# Altium schematic symbol library AliPadash.SchLib: 1186 symbols (part 1 of 6) (continued)
## 1488
designator U?
footprint DIP14
part A pins: 1 V- (power) hidden to V-, 2 (in), 3 (oc), 7 GND (power) hidden to GND, 14 V+ (power) hidden to V+
part B pins: 1 V- (power) hidden to V-, 4 (in), 5 (in), 6 (oc), 7 GND (power) hidden to GND, 14 V+ (power) hidden to V+
part C pins: 1 V- (power) hidden to V-, 7 GND (power) hidden to GND, 8 (oc), 9 (in), 10 (in), 14 V+ (power) hidden to V+
part D pins: 1 V- (power) hidden to V-, 7 GND (power) hidden to GND, 11 (oc), 12 (in), 13 (in), 14 V+ (power) hidden to V+

## 1489
designator U?
footprint DIP14
part A pins: 1 I (in), 2 RC (in), 3 O (out), 7 GND (power) hidden to GND, 14 VCC (power) hidden to VCC
part B pins: 4 I (in), 5 RC (in), 6 O (out), 7 GND (power) hidden to GND, 14 VCC (power) hidden to VCC
part C pins: 7 GND (power) hidden to GND, 8 O (out), 9 RC (in), 10 I (in), 14 VCC (power) hidden to VCC
part D pins: 7 GND (power) hidden to GND, 11 O (out), 12 RC (in), 13 I (in), 14 VCC (power) hidden to VCC

## 2681-40PIN
designator U?
footprint DIP40
pins: 1 A0 (in), 2 IP3 (in), 3 A1 (in), 4 IP1 (in), 5 A2 (in), 6 A3 (in), 7 IP0 (in), 8 WRN (in), 9 RDN (in), 10 RXDB (in), 11 TXDB (out), 12 OP1 (out), 13 OP3 (out), 14 OP5 (out), 15 OP7 (out), 16 D1 (io), 17 D3 (io), 18 D5 (io), 19 D7 (io), 20 GND (power), 21 INTRN (out), 22 D6 (io), 23 D4 (io), 24 D2 (io), 25 D0 (io), 26 OP6 (out), 27 OP4 (out), 28 OP2 (out), 29 OP0 (out), 30 TXDA (out), 31 RXDA (in), 32 X1/CLK (in), 33 X2 (in), 34 RESET (in), 35 CEN (in), 36 IP2 (in), 37 IP6 (in), 38 IP5 (in), 39 IP4 (in), 40 VCC (power)

## 4052
designator ?
pins: 1 Y0, 2 Y2, 3 Y, 4 Y3, 5 Y1, 6 INH (in), 7 VEE, 8 GND (power), 9 B (in), 10 A (in), 11 X3, 12 X0, 13 X, 14 X1, 15 X2, 16 VCC (power)

## 4098
designator ?
part A pins: 1 1Cext, 2 1RCext, 3 ~{1R}, 4 1TR+, 5 ~{1TR-}, 6 1Q, 7 ~{1Q}, 8 GND, 16 VDD
part B pins: 8 GND, 9 ~{2Q}, 10 2Q, 11 ~{2TR-}, 12 2TR+, 13 ~{2R}, 14 2RCext, 15 2Cext, 16 VDD

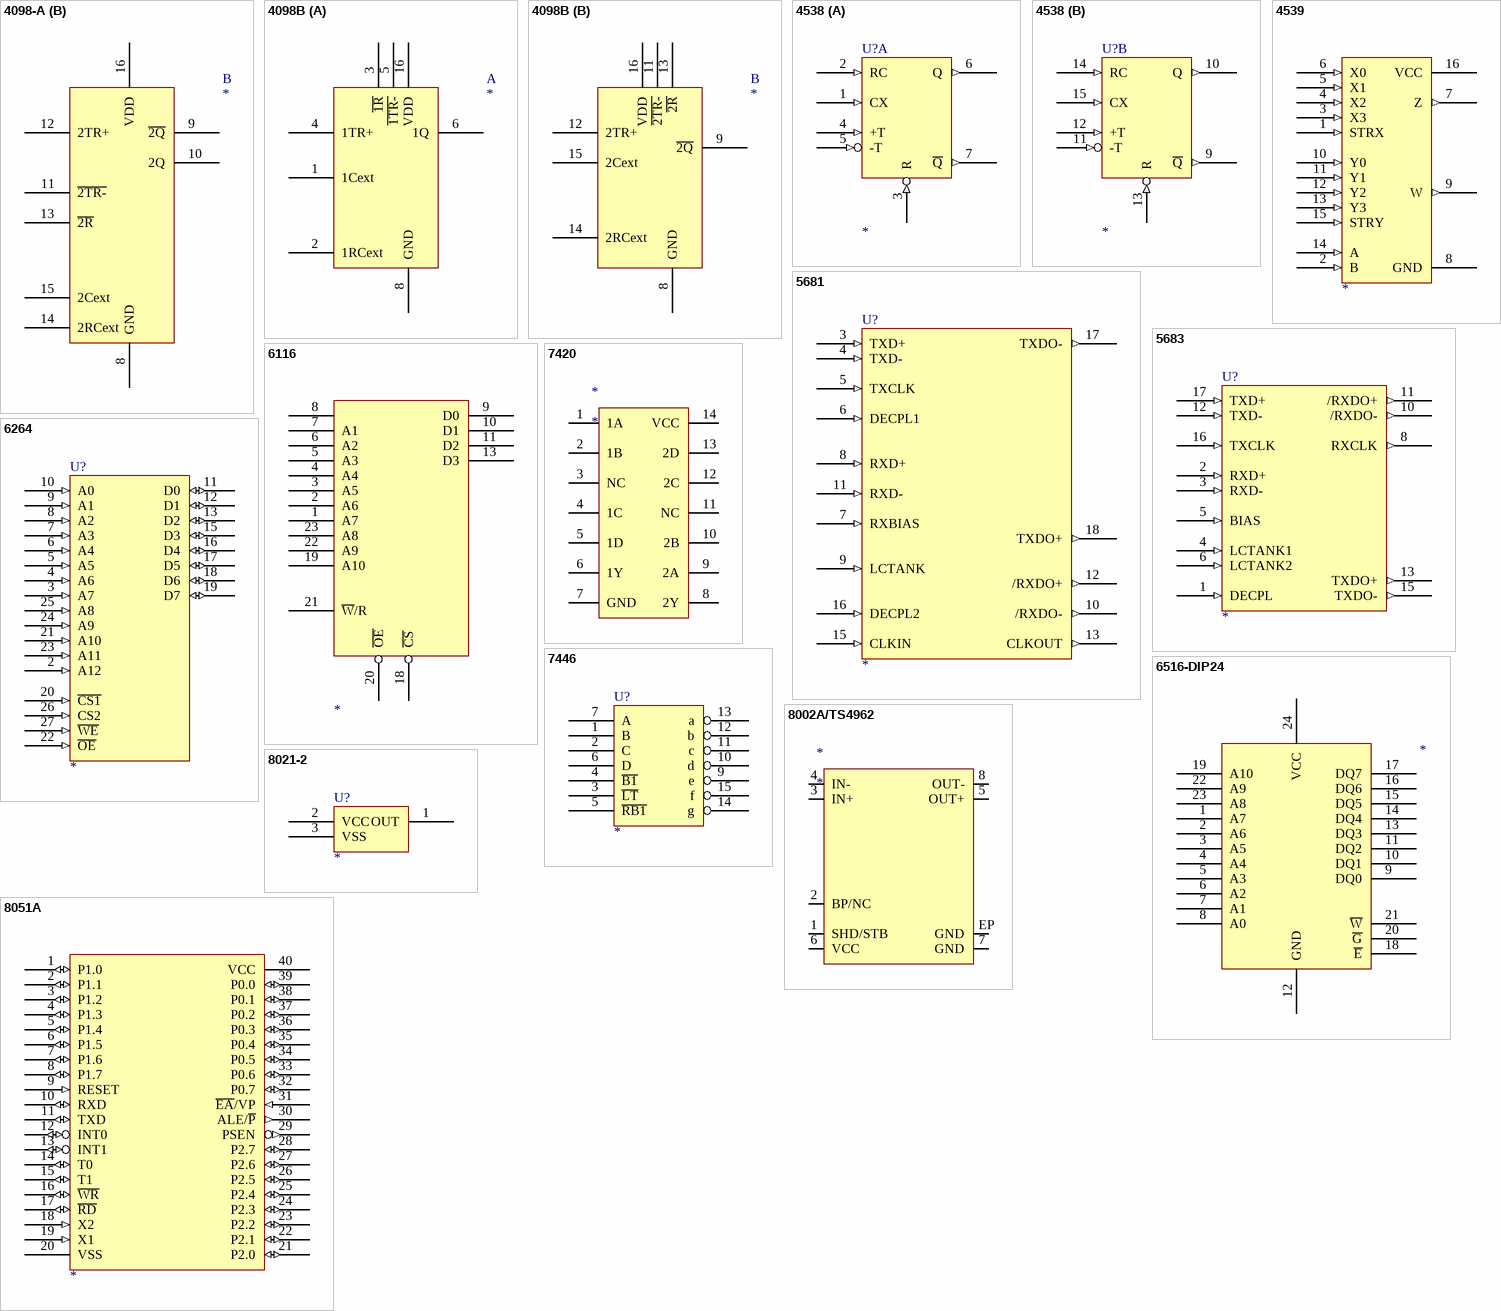
[diagram p4: symbols 4098-A to 8051A]

## 4098-A
designator ?
part A pins: 1 1Cext, 2 1RCext, 3 ~{1R}, 4 1TR+, 5 ~{1TR-}, 6 1Q, 7 ~{1Q}, 8 GND, 16 VDD
part B pins: 8 GND, 9 ~{2Q}, 10 2Q, 11 ~{2TR-}, 12 2TR+, 13 ~{2R}, 14 2RCext, 15 2Cext, 16 VDD

## 4098B
designator ?
part A pins: 1 1Cext, 2 1RCext, 3 ~{1R}, 4 1TR+, 5 ~{1TR-}, 6 1Q, 8 GND, 16 VDD
part B pins: 8 GND, 9 ~{2Q}, 11 ~{2TR-}, 12 2TR+, 13 ~{2R}, 14 2RCext, 15 2Cext, 16 VDD

## 4538
designator U?
part A pins: 1 CX (in), 2 RC (in), 3 R (in), 4 +T (in), 5 -T (in), 6 Q (out), 7 ~{Q} (out), 8 VSS (power) hidden to VSS, 16 VDD (power) hidden to VDD
part B pins: 8 VSS (power) hidden to VSS, 9 ~{Q} (out), 10 Q (out), 11 -T (in), 12 +T (in), 13 R (in), 14 RC (in), 15 CX (in), 16 VDD (power) hidden to VDD

## 4539
designator ?
pins: 1 STRX (in), 2 B (in), 3 X3 (in), 4 X2 (in), 5 X1 (in), 6 X0 (in), 7 Z (out), 8 GND (power), 9 W (out), 10 Y0 (in), 11 Y1 (in), 12 Y2 (in), 13 Y3 (in), 14 A (in), 15 STRY (in), 16 VCC (power)

## 5681
designator U?
pins: 1 GND (power) hidden to GND, 2 GND (power) hidden to GND, 3 TXD+ (in), 4 TXD- (in), 5 TXCLK (in), 6 DECPL1 (in), 7 RXBIAS (in), 8 RXD+ (in), 9 LCTANK (in), 10 /RXDO- (out), 11 RXD- (in), 12 /RXDO+ (out), 13 CLKOUT (out), 14 VEE (power) hidden to VEE, 15 CLKIN (in), 16 DECPL2 (in), 17 TXDO- (out), 18 TXDO+ (out)

## 5683
designator U?
pins: 1 DECPL (in), 2 RXD+ (in), 3 RXD- (in), 4 LCTANK1 (in), 5 BIAS (in), 6 LCTANK2 (in), 7 GND (power) hidden to GND, 8 RXCLK (out), 9 VCC (power) hidden to VCC, 10 /RXDO- (out), 11 /RXDO+ (out), 12 TXD- (in), 13 TXDO+ (out), 14 GND (power) hidden to GND, 15 TXDO- (out), 16 TXCLK (in), 17 TXD+ (in), 18 VCC (power) hidden to VCC

## 6116
designator ?
pins: 1 A7, 2 A6, 3 A5, 4 A4, 5 A3, 6 A2, 7 A1, 8 A0, 9 D0, 10 D1, 11 D2, 13 D3, 18 ~{CS}, 19 A10, 20 ~{OE}, 21 ~{W}/R, 22 A9, 23 A8

## 6264
designator U?
pins: 2 A12 (in), 3 A7 (in), 4 A6 (in), 5 A5 (in), 6 A4 (in), 7 A3 (in), 8 A2 (in), 9 A1 (in), 10 A0 (in), 11 D0 (io), 12 D1 (io), 13 D2 (io), 14 GND (power) hidden to GND, 15 D3 (io), 16 D4 (io), 17 D5 (io), 18 D6 (io), 19 D7 (io), 20 ~{CS1} (in), 21 A10 (in), 22 ~{OE} (in), 23 A11 (in), 24 A9 (in), 25 A8 (in), 26 CS2 (in), 27 ~{WE} (in), 28 VCC (power) hidden to VCC

## 6516-DIP24
designator ?
U?
footprint DIP24
pins: 1 A7, 2 A6, 3 A5, 4 A4, 5 A3, 6 A2, 7 A1, 8 A0, 9 DQ0, 10 DQ1, 11 DQ2, 12 GND (power), 13 DQ3, 14 DQ4, 15 DQ5, 16 DQ6, 17 DQ7, 18 ~{E}, 19 A10, 20 ~{G}, 21 ~{W}, 22 A9, 23 A8, 24 VCC (power)

## 7420
designator *
pins: 1 1A, 2 1B, 3 NC, 4 1C, 5 1D, 6 1Y, 7 GND, 8 2Y, 9 2A, 10 2B, 11 NC, 12 2C, 13 2D, 14 VCC

## 7446
designator U?
footprint DIP16
pins: 1 B, 2 C, 3 ~{LT}, 4 ~{B1}, 5 ~{RB1}, 6 D, 7 A, 8 GND (power) hidden to GND, 9 e (oc), 10 d (oc), 11 c (oc), 12 b (oc), 13 a (oc), 14 g (oc), 15 f (oc), 16 VCC (power) hidden to VCC

## 8002A/TS4962
designator *
footprint SO-8/DFN8 (Footprint not found)
pins: 1 SHD/STB, 2 BP/NC, 3 IN+, 4 IN-, 5 OUT+, 6 VCC, 7 GND, 8 OUT-, EP GND

## 8021-2
designator U?
footprint TO-92
pins: 1 OUT, 2 VCC, 3 VSS

## 8051A
designator ?
pins: 1 P1.0 (io), 2 P1.1 (io), 3 P1.2 (io), 4 P1.3 (io), 5 P1.4 (io), 6 P1.5 (io), 7 P1.6 (io), 8 P1.7 (io), 9 RESET (in), 10 RXD (io), 11 TXD (io), 12 INT0 (io), 13 INT1 (io), 14 T0 (io), 15 T1 (io), 16 ~{WR} (io), 17 ~{RD} (io), 18 X2 (in), 19 X1 (in), 20 VSS (power), 21 P2.0 (io), 22 P2.1 (io), 23 P2.2 (io), 24 P2.3 (io), 25 P2.4 (io), 26 P2.5 (io), 27 P2.6 (io), 28 P2.7 (io), 29 PSEN (out), 30 ALE/~{P} (out), 31 ~{EA}/VP (in), 32 P0.7 (io), 33 P0.6 (io), 34 P0.5 (io), 35 P0.4 (io), 36 P0.3 (io), 37 P0.2 (io), 38 P0.1 (io), 39 P0.0 (io), 40 VCC (power)

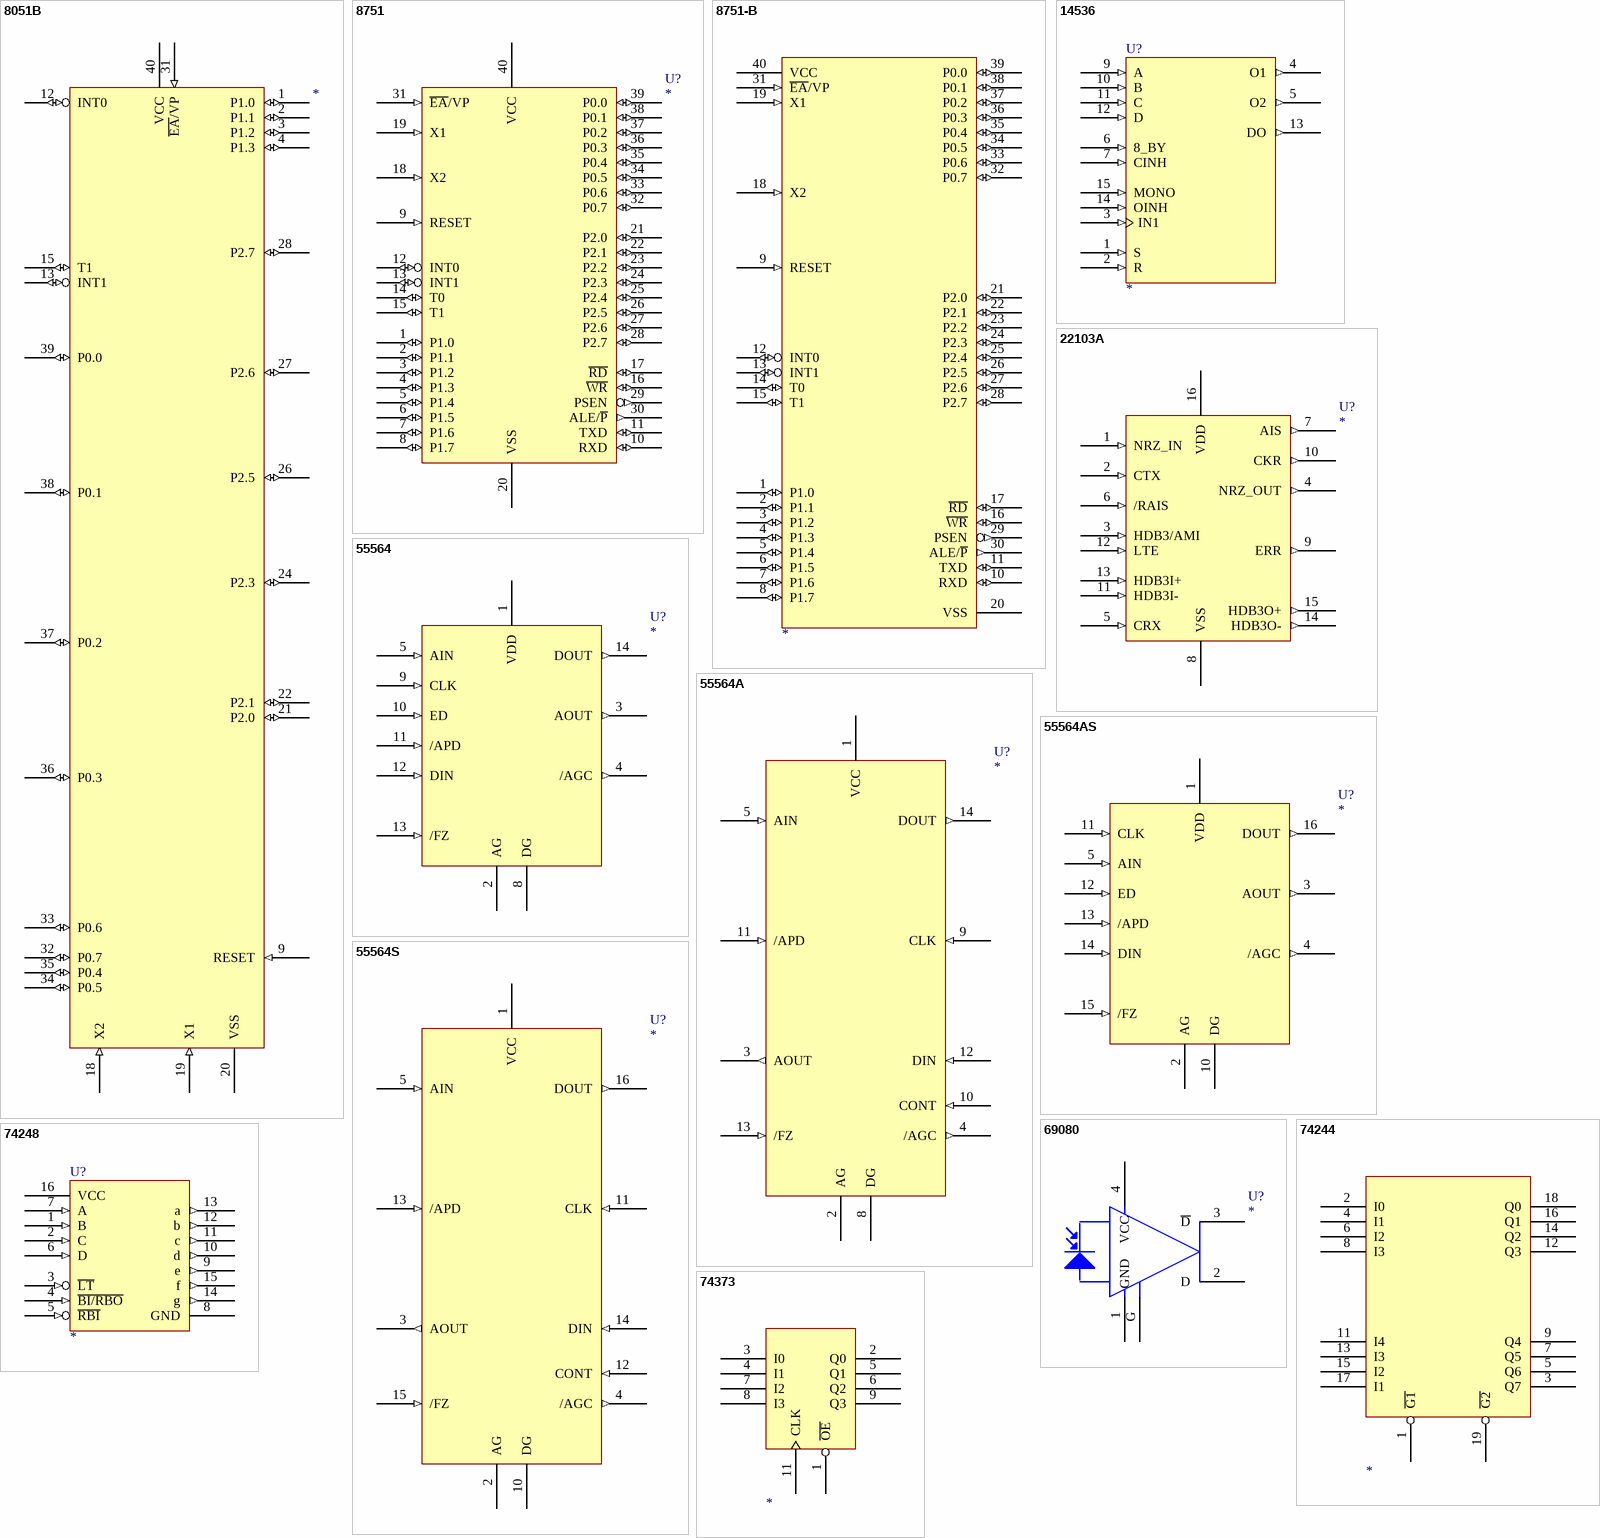
[diagram p5: symbols 8051B to 74373]

## 8051B
designator ?
pins: 1 P1.0 (io), 2 P1.1 (io), 3 P1.2 (io), 4 P1.3 (io), 9 RESET (in), 12 INT0 (io), 13 INT1 (io), 15 T1 (io), 18 X2 (in), 19 X1 (in), 20 VSS (power), 21 P2.0 (io), 22 P2.1 (io), 24 P2.3 (io), 26 P2.5 (io), 27 P2.6 (io), 28 P2.7 (io), 31 ~{EA}/VP (in), 32 P0.7 (io), 33 P0.6 (io), 34 P0.5 (io), 35 P0.4 (io), 36 P0.3 (io), 37 P0.2 (io), 38 P0.1 (io), 39 P0.0 (io), 40 VCC (power)

## 8751
designator U?
pins: 1 P1.0 (io), 2 P1.1 (io), 3 P1.2 (io), 4 P1.3 (io), 5 P1.4 (io), 6 P1.5 (io), 7 P1.6 (io), 8 P1.7 (io), 9 RESET (in), 10 RXD (io), 11 TXD (io), 12 INT0 (io), 13 INT1 (io), 14 T0 (io), 15 T1 (io), 16 ~{WR} (io), 17 ~{RD} (io), 18 X2 (in), 19 X1 (in), 20 VSS (power), 21 P2.0 (io), 22 P2.1 (io), 23 P2.2 (io), 24 P2.3 (io), 25 P2.4 (io), 26 P2.5 (io), 27 P2.6 (io), 28 P2.7 (io), 29 PSEN (out), 30 ALE/~{P} (out), 31 ~{EA}/VP (in), 32 P0.7 (io), 33 P0.6 (io), 34 P0.5 (io), 35 P0.4 (io), 36 P0.3 (io), 37 P0.2 (io), 38 P0.1 (io), 39 P0.0 (io), 40 VCC (power)

## 8751-B
designator ?
pins: 1 P1.0 (io), 2 P1.1 (io), 3 P1.2 (io), 4 P1.3 (io), 5 P1.4 (io), 6 P1.5 (io), 7 P1.6 (io), 8 P1.7 (io), 9 RESET (in), 10 RXD (io), 11 TXD (io), 12 INT0 (io), 13 INT1 (io), 14 T0 (io), 15 T1 (io), 16 ~{WR} (io), 17 ~{RD} (io), 18 X2 (in), 19 X1 (in), 20 VSS (power), 21 P2.0 (io), 22 P2.1 (io), 23 P2.2 (io), 24 P2.3 (io), 25 P2.4 (io), 26 P2.5 (io), 27 P2.6 (io), 28 P2.7 (io), 29 PSEN (out), 30 ALE/~{P} (out), 31 ~{EA}/VP (in), 32 P0.7 (io), 33 P0.6 (io), 34 P0.5 (io), 35 P0.4 (io), 36 P0.3 (io), 37 P0.2 (io), 38 P0.1 (io), 39 P0.0 (io), 40 VCC (power)

## 14536
designator U?
footprint DIP16
pins: 1 S (in), 2 R (in), 3 IN1 (in), 4 O1 (out), 5 O2 (out), 6 8_BY (in), 7 CINH (in), 8 GND (power) hidden to GND, 9 A (in), 10 B (in), 11 C (in), 12 D (in), 13 DO (out), 14 OINH (in), 15 MONO (in), 16 VCC (power) hidden to VCC

## 22103A
designator U?
footprint DIP16
pins: 1 NRZ_IN (in), 2 CTX (in), 3 HDB3/AMI (in), 4 NRZ_OUT (out), 5 CRX (in), 6 /RAIS (in), 7 AIS (out), 8 VSS (power), 9 ERR (out), 10 CKR (out), 11 HDB3I- (in), 12 LTE (in), 13 HDB3I+ (in), 14 HDB3O- (out), 15 HDB3O+ (out), 16 VDD (power)

## 55564
designator U?
pins: 1 VDD, 2 AG, 3 AOUT (out), 4 /AGC (out), 5 AIN (in), 8 DG, 9 CLK (in), 10 ED (in), 11 /APD (in), 12 DIN (in), 13 /FZ (in), 14 DOUT (out)

## 55564A
designator U?
pins: 1 VCC, 2 AG, 3 AOUT (out), 4 /AGC (out), 5 AIN (in), 8 DG, 9 CLK (in), 10 CONT (in), 11 /APD (in), 12 DIN (in), 13 /FZ (in), 14 DOUT (out)

## 55564AS
designator U?
pins: 1 VDD, 2 AG, 3 AOUT (out), 4 /AGC (out), 5 AIN (in), 10 DG, 11 CLK (in), 12 ED (in), 13 /APD (in), 14 DIN (in), 15 /FZ (in), 16 DOUT (out)

## 55564S
designator U?
pins: 1 VCC, 2 AG, 3 AOUT (out), 4 /AGC (out), 5 AIN (in), 10 DG, 11 CLK (in), 12 CONT (in), 13 /APD (in), 14 DIN (in), 15 /FZ (in), 16 DOUT (out)

## 69080
designator U?
footprint LDHP3
pins: 1 GND, 2 D, 3 ~{D}, 4 VCC, G

## 74244
designator ?
pins: 1 ~{G1}, 2 I0, 3 Q7, 4 I1, 5 Q6, 6 I2, 7 Q5, 8 I3, 9 Q4, 11 I4, 12 Q3, 13 I3, 14 Q2, 15 I2, 16 Q1, 17 I1, 18 Q0, 19 ~{G2}

## 74248
designator U?
footprint DIP16
pins: 1 B (in), 2 C (in), 3 ~{LT} (in), 4 ~{BI/RBO} (in), 5 ~{RBI} (in), 6 D (in), 7 A (in), 8 GND (power), 9 e (out), 10 d (out), 11 c (out), 12 b (out), 13 a (out), 14 g (out), 15 f (out), 16 VCC (power)

## 74373
designator ?
pins: 1 ~{OE}, 2 Q0, 3 I0, 4 I1, 5 Q1, 6 Q2, 7 I2, 8 I3, 9 Q3, 11 CLK

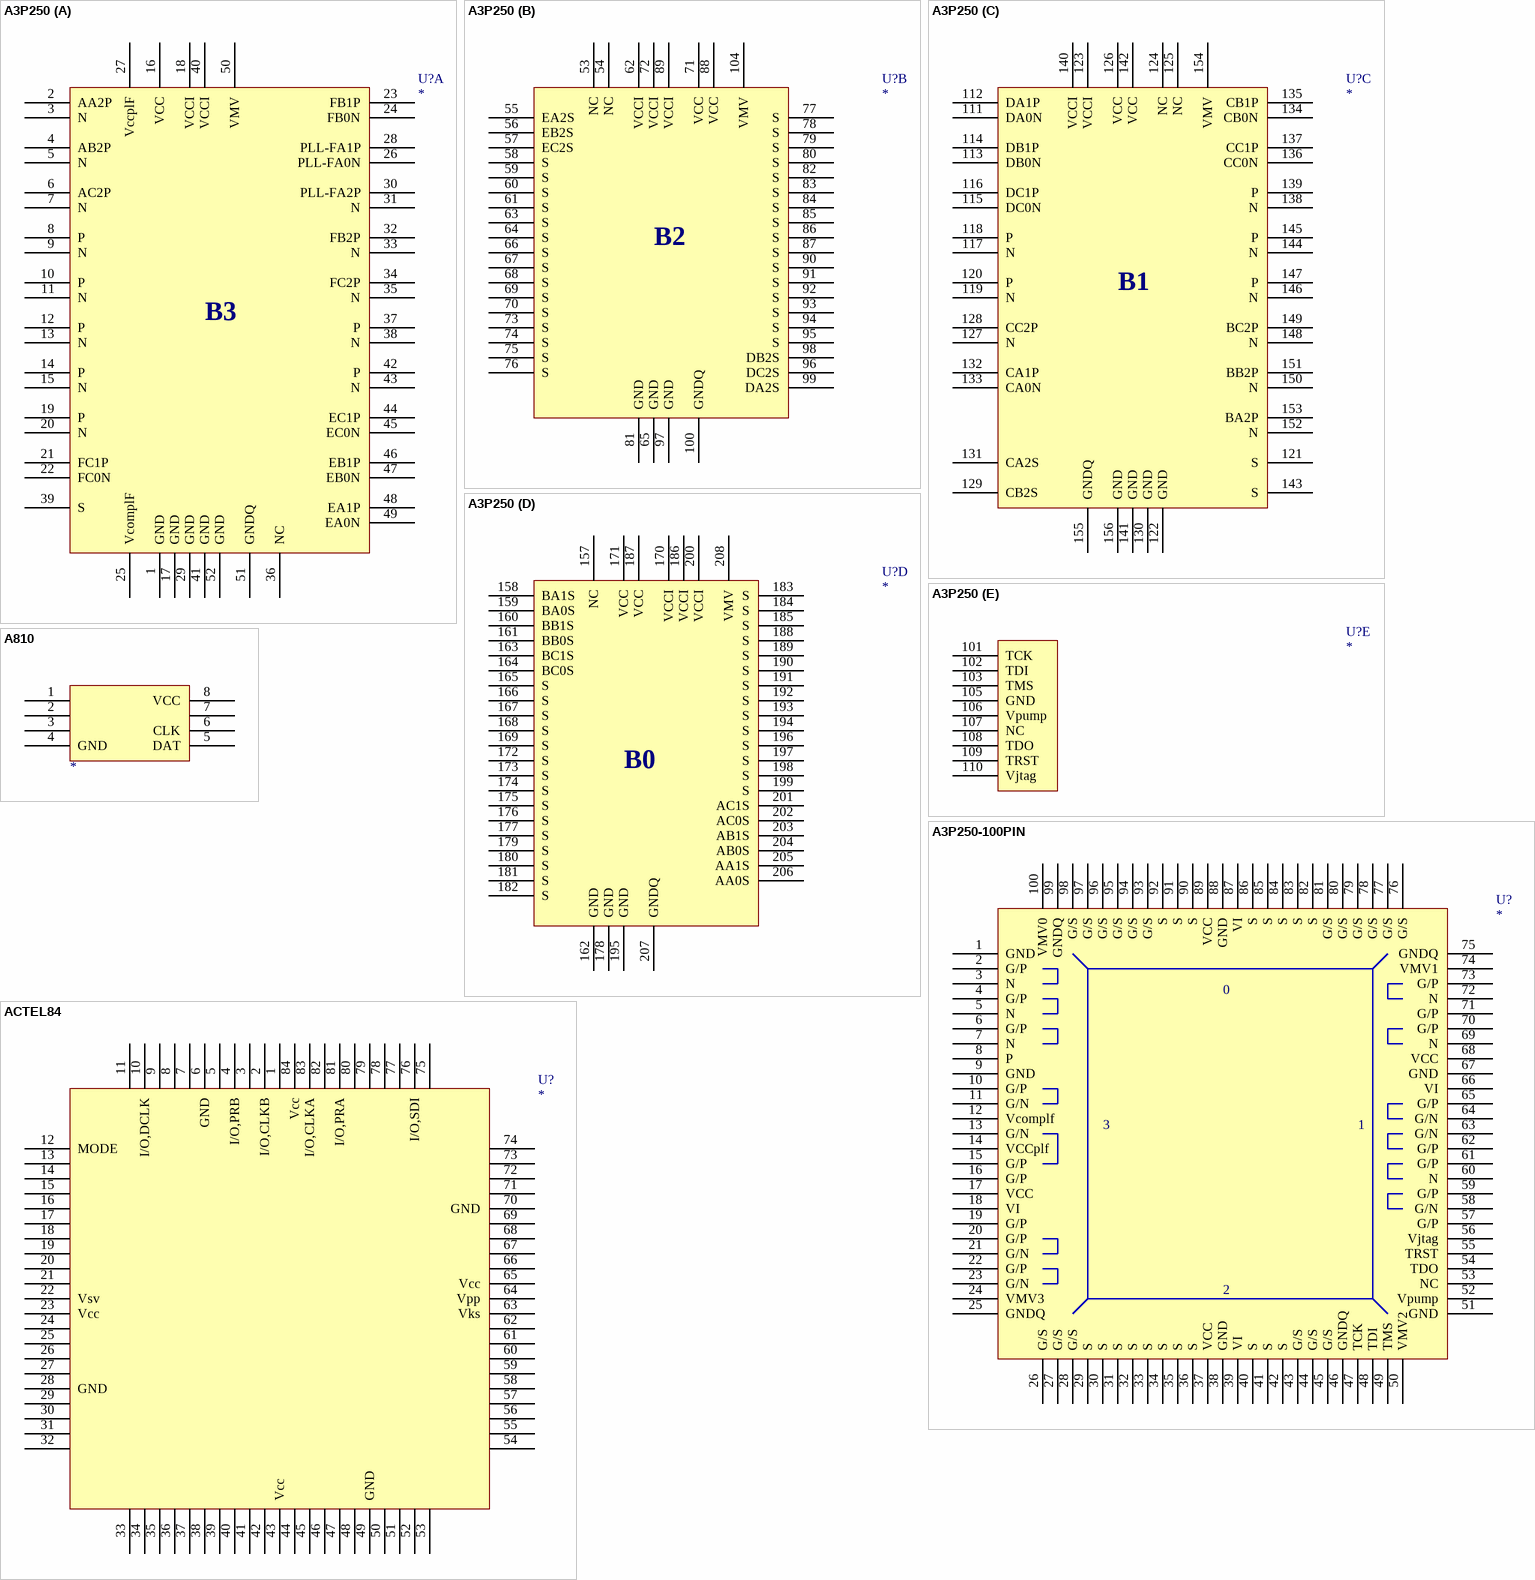
[diagram p6: symbols A3P250 to ACTEL84]

## A3P250
designator U?
footprint PQFP208
part A pins: 1 GND, 2 AA2P, 3 N, 4 AB2P, 5 N, 6 AC2P, 7 N, 8 P, 9 N, 10 P, 11 N, 12 P, 13 N, 14 P, 15 N, 16 VCC, 17 GND, 18 VCCI, 19 P, 20 N, 21 FC1P, 22 FC0N, 23 FB1P, 24 FB0N, 25 VcomplF, 26 PLL-FA0N, 27 VccplF, 28 PLL-FA1P, 29 GND, 30 PLL-FA2P, 31 N, 32 FB2P, 33 N, 34 FC2P, 35 N, 36 NC, 37 P, 38 N, 39 S, 40 VCCI, 41 GND, 42 P, 43 N, 44 EC1P, 45 EC0N, 46 EB1P, 47 EB0N, 48 EA1P, 49 EA0N, 50 VMV, 51 GNDQ, 52 GND
part B pins: 53 NC, 54 NC, 55 EA2S, 56 EB2S, 57 EC2S, 58 S, 59 S, 60 S, 61 S, 62 VCCI, 63 S, 64 S, 65 GND, 66 S, 67 S, 68 S, 69 S, 70 S, 71 VCC, 72 VCCI, 73 S, 74 S, 75 S, 76 S, 77 S, 78 S, 79 S, 80 S, 81 GND, 82 S, 83 S, 84 S, 85 S, 86 S, 87 S, 88 VCC, 89 VCCI, 90 S, 91 S, 92 S, 93 S, 94 S, 95 S, 96 DC2S, 97 GND, 98 DB2S, 99 DA2S, 100 GNDQ, 104 VMV
part C pins: 111 DA0N, 112 DA1P, 113 DB0N, 114 DB1P, 115 DC0N, 116 DC1P, 117 N, 118 P, 119 N, 120 P, 121 S, 122 GND, 123 VCCI, 124 NC, 125 NC, 126 VCC, 127 N, 128 CC2P, 129 CB2S, 130 GND, 131 CA2S, 132 CA1P, 133 CA0N, 134 CB0N, 135 CB1P, 136 CC0N, 137 CC1P, 138 N, 139 P, 140 VCCI, 141 GND, 142 VCC, 143 S, 144 N, 145 P, 146 N, 147 P, 148 N, 149 BC2P, 150 N, 151 BB2P, 152 N, 153 BA2P, 154 VMV, 155 GNDQ, 156 GND
part D pins: 157 NC, 158 BA1S, 159 BA0S, 160 BB1S, 161 BB0S, 162 GND, 163 BC1S, 164 BC0S, 165 S, 166 S, 167 S, 168 S, 169 S, 170 VCCI, 171 VCC, 172 S, 173 S, 174 S, 175 S, 176 S, 177 S, 178 GND, 179 S, 180 S, 181 S, 182 S, 183 S, 184 S, 185 S, 186 VCCI, 187 VCC, 188 S, 189 S, 190 S, 191 S, 192 S, 193 S, 194 S, 195 GND, 196 S, 197 S, 198 S, 199 S, 200 VCCI, 201 AC1S, 202 AC0S, 203 AB1S, 204 AB0S, 205 AA1S, 206 AA0S, 207 GNDQ, 208 VMV
part E pins: 101 TCK, 102 TDI, 103 TMS, 105 GND, 106 Vpump, 107 NC, 108 TDO, 109 TRST, 110 Vjtag
part A text: B3
part B text: B2
part C text: B1
part D text: B0

## A3P250-100PIN
designator U?
footprint PQFP100
pins: 1 GND, 2 G/P, 3 N, 4 G/P, 5 N, 6 G/P, 7 N, 8 P, 9 GND, 10 G/P, 11 G/N, 12 Vcomplf, 13 G/N, 14 VCCplf, 15 G/P, 16 G/P, 17 VCC, 18 VI, 19 G/P, 20 G/P, 21 G/N, 22 G/P, 23 G/N, 24 VMV3, 25 GNDQ, 26 G/S, 27 G/S, 28 G/S, 29 S, 30 S, 31 S, 32 S, 33 S, 34 S, 35 S, 36 S, 37 VCC, 38 GND, 39 VI, 40 S, 41 S, 42 S, 43 G/S, 44 G/S, 45 G/S, 46 GNDQ, 47 TCK, 48 TDI, 49 TMS, 50 VMV2, 51 GND, 52 Vpump, 53 NC, 54 TDO, 55 TRST, 56 Vjtag, 57 G/P, 58 G/N, 59 G/P, 60 N, 61 G/P, 62 G/P, 63 G/N, 64 G/N, 65 G/P, 66 VI, 67 GND, 68 VCC, 69 N, 70 G/P, 71 G/P, 72 N, 73 G/P, 74 VMV1, 75 GNDQ, 76 G/S, 77 G/S, 78 G/S, 79 G/S, 80 G/S, 81 G/S, 82 S, 83 S, 84 S, 85 S, 86 S, 87 VI, 88 GND, 89 VCC, 90 S, 91 S, 92 S, 93 G/S, 94 G/S, 95 G/S, 96 G/S, 97 G/S, 98 G/S, 99 GNDQ, 100 VMV0
text: 0

## A810
designator ?
pins: 1, 2, 3, 4 GND, 5 DAT, 6 CLK, 7, 8 VCC

## ACTEL84
designator U?
pins: 1, 2 I/O,CLKB, 3, 4 I/O,PRB, 5, 6 GND, 7, 8, 9, 10 I/O,DCLK, 11, 12 MODE, 13, 14, 15, 16, 17, 18, 19, 20, 21, 22 Vsv, 23 Vcc, 24, 25, 26, 27, 28 GND, 29, 30, 31, 32, 33, 34, 35, 36, 37, 38, 39, 40, 41, 42, 43 Vcc, 44, 45, 46, 47, 48, 49 GND, 50, 51, 52, 53, 54, 55, 56, 57, 58, 59, 60, 61, 62, 63 Vks, 64 Vpp, 65 Vcc, 66, 67, 68, 69, 70 GND, 71, 72, 73, 74, 75, 76 I/O,SDI, 77, 78, 79, 80, 81 I/O,PRA, 82, 83 I/O,CLKA, 84 Vcc

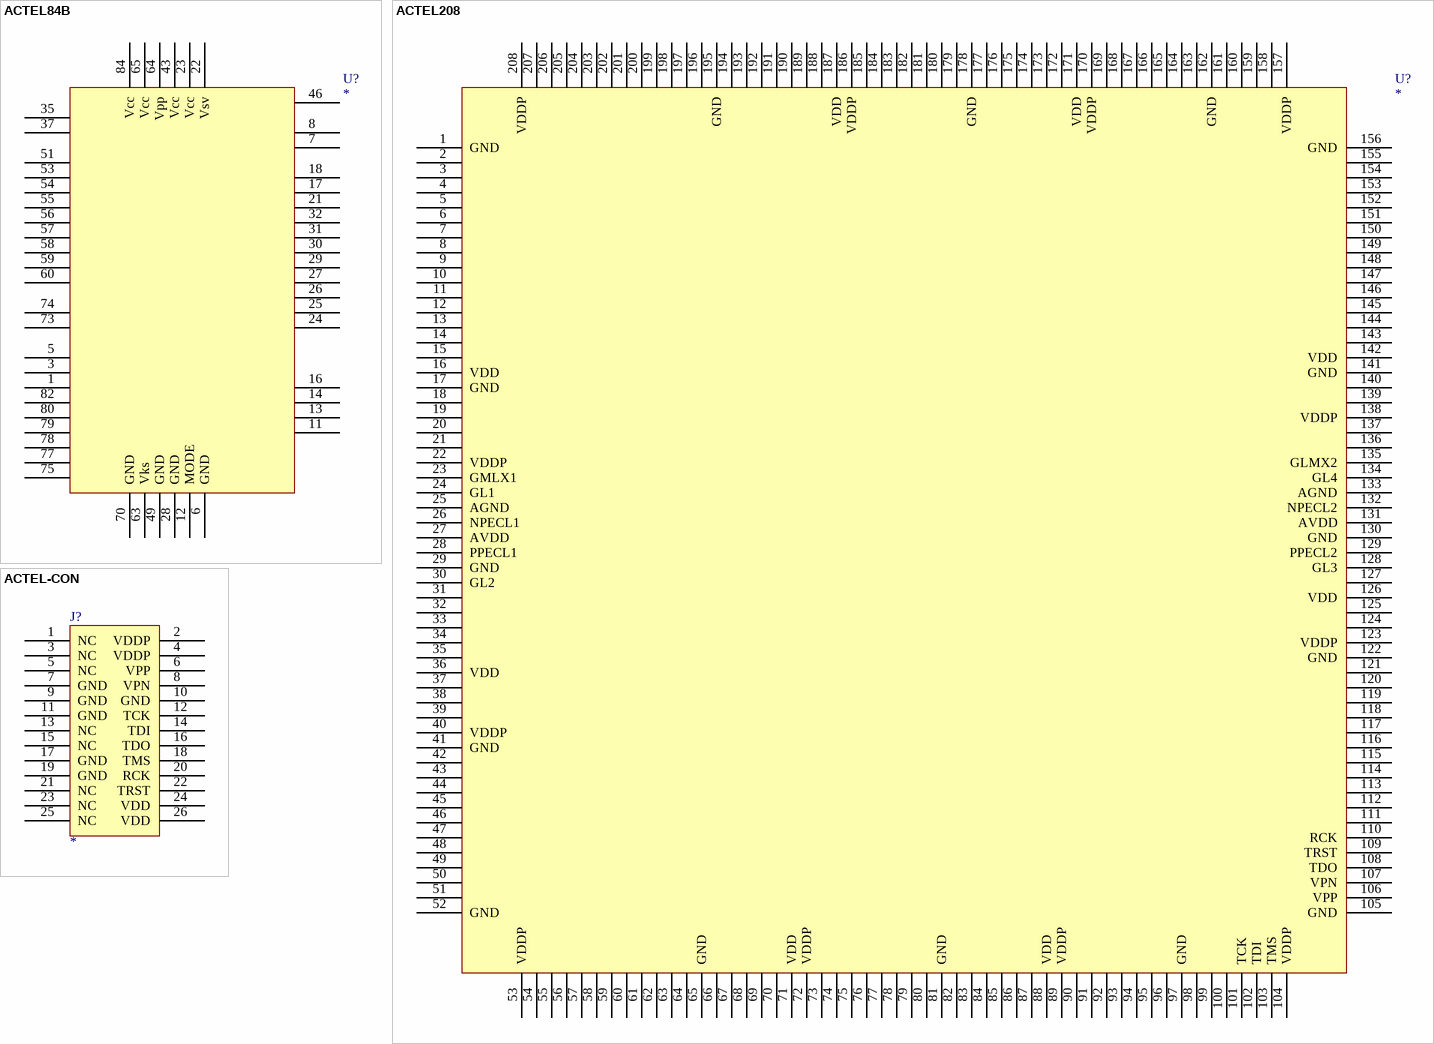
[diagram p7: symbols ACTEL84B to ACTEL-CON]

## ACTEL84B
designator U?
pins: 1, 3, 5, 6 GND, 7, 8, 11, 12 MODE, 13, 14, 16, 17, 18, 21, 22 Vsv, 23 Vcc, 24, 25, 26, 27, 28 GND, 29, 30, 31, 32, 35, 37, 43 Vcc, 46, 49 GND, 51, 53, 54, 55, 56, 57, 58, 59, 60, 63 Vks, 64 Vpp, 65 Vcc, 70 GND, 73, 74, 75, 77, 78, 79, 80, 82, 84 Vcc

## ACTEL208
designator U?
footprint PQFP208
pins: 1 GND, 2, 3, 4, 5, 6, 7, 8, 9, 10, 11, 12, 13, 14, 15, 16 VDD, 17 GND, 18, 19, 20, 21, 22 VDDP, 23 GMLX1, 24 GL1, 25 AGND, 26 NPECL1, 27 AVDD, 28 PPECL1, 29 GND, 30 GL2, 31, 32, 33, 34, 35, 36 VDD, 37, 38, 39, 40 VDDP, 41 GND, 42, 43, 44, 45, 46, 47, 48, 49, 50, 51, 52 GND, 53 VDDP, 54, 55, 56, 57, 58, 59, 60, 61, 62, 63, 64, 65 GND, 66, 67, 68, 69, 70, 71 VDD, 72 VDDP, 73, 74, 75, 76, 77, 78, 79, 80, 81 GND, 82, 83, 84, 85, 86, 87, 88 VDD, 89 VDDP, 90, 91, 92, 93, 94, 95, 96, 97 GND, 98, 99, 100, 101 TCK, 102 TDI, 103 TMS, 104 VDDP, 105 GND, 106 VPP, 107 VPN, 108 TDO, 109 TRST, 110 RCK, 111, 112, 113, 114, 115, 116, 117, 118, 119, 120, 121, 122 GND, 123 VDDP, 124, 125, 126 VDD, 127, 128 GL3, 129 PPECL2, 130 GND, 131 AVDD, 132 NPECL2, 133 AGND, 134 GL4, 135 GLMX2, 136, 137, 138 VDDP, 139, 140, 141 GND, 142 VDD, 143, 144, 145, 146, 147, 148, 149, 150, 151, 152, 153, 154, 155, 156 GND, 157 VDDP, 158, 159, 160, 161, 162 GND, 163, 164, 165, 166, 167, 168, 169, 170 VDDP, 171 VDD, 172, 173, 174, 175, 176, 177, 178 GND, 179, 180, 181, 182, 183, 184, 185, 186 VDDP, 187 VDD, 188, 189, 190, 191, 192, 193, 194, 195 GND, 196, 197, 198, 199, 200, 201, 202, 203, 204, 205, 206, 207, 208 VDDP

## ACTEL-CON
designator J?
footprint FPGAP26
pins: 1 NC, 2 VDDP, 3 NC, 4 VDDP, 5 NC, 6 VPP, 7 GND, 8 VPN, 9 GND, 10 GND, 11 GND, 12 TCK, 13 NC, 14 TDI, 15 NC, 16 TDO, 17 GND, 18 TMS, 19 GND, 20 RCK, 21 NC, 22 TRST, 23 NC, 24 VDD, 25 NC, 26 VDD

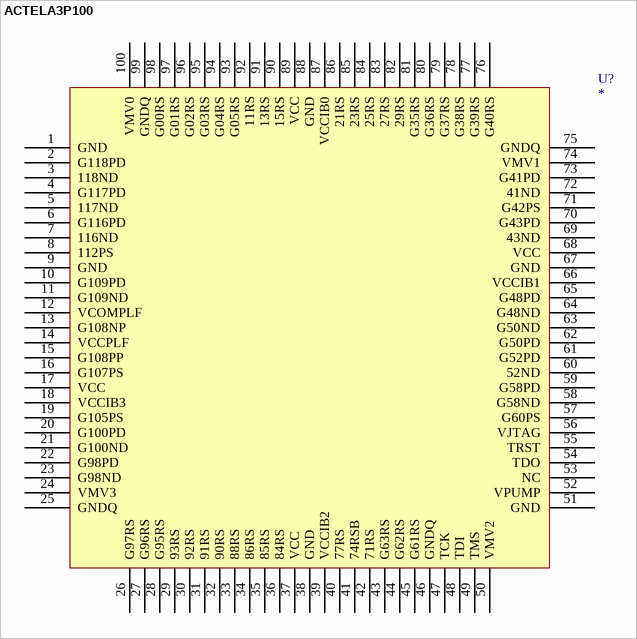
[diagram p8: symbol ACTELA3P100]

## ACTELA3P100
designator U?
footprint TQFP-100(FPGA)
pins: 1 GND, 2 G118PD, 3 118ND, 4 G117PD, 5 117ND, 6 G116PD, 7 116ND, 8 112PS, 9 GND, 10 G109PD, 11 G109ND, 12 VCOMPLF, 13 G108NP, 14 VCCPLF, 15 G108PP, 16 G107PS, 17 VCC, 18 VCCIB3, 19 G105PS, 20 G100PD, 21 G100ND, 22 G98PD, 23 G98ND, 24 VMV3, 25 GNDQ, 26 G97RS, 27 G96RS, 28 G95RS, 29 93RS, 30 92RS, 31 91RS, 32 90RS, 33 88RS, 34 86RS, 35 85RS, 36 84RS, 37 VCC, 38 GND, 39 VCCIB2, 40 77RS, 41 74RSB, 42 71RS, 43 G63RS, 44 G62RS, 45 G61RS, 46 GNDQ, 47 TCK, 48 TDI, 49 TMS, 50 VMV2, 51 GND, 52 VPUMP, 53 NC, 54 TDO, 55 TRST, 56 VJTAG, 57 G60PS, 58 G58ND, 59 G58PD, 60 52ND, 61 G52PD, 62 G50PD, 63 G50ND, 64 G48ND, 65 G48PD, 66 VCCIB1, 67 GND, 68 VCC, 69 43ND, 70 G43PD, 71 G42PS, 72 41ND, 73 G41PD, 74 VMV1, 75 GNDQ, 76 G40RS, 77 G39RS, 78 G38RS, 79 G37RS, 80 G36RS, 81 G35RS, 82 29RS, 83 27RS, 84 25RS, 85 23RS, 86 21RS, 87 VCCIB0, 88 GND, 89 VCC, 90 15RS, 91 13RS, 92 11RS, 93 G05RS, 94 G04RS, 95 G03RS, 96 G02RS, 97 G01RS, 98 G00RS, 99 GNDQ, 100 VMV0

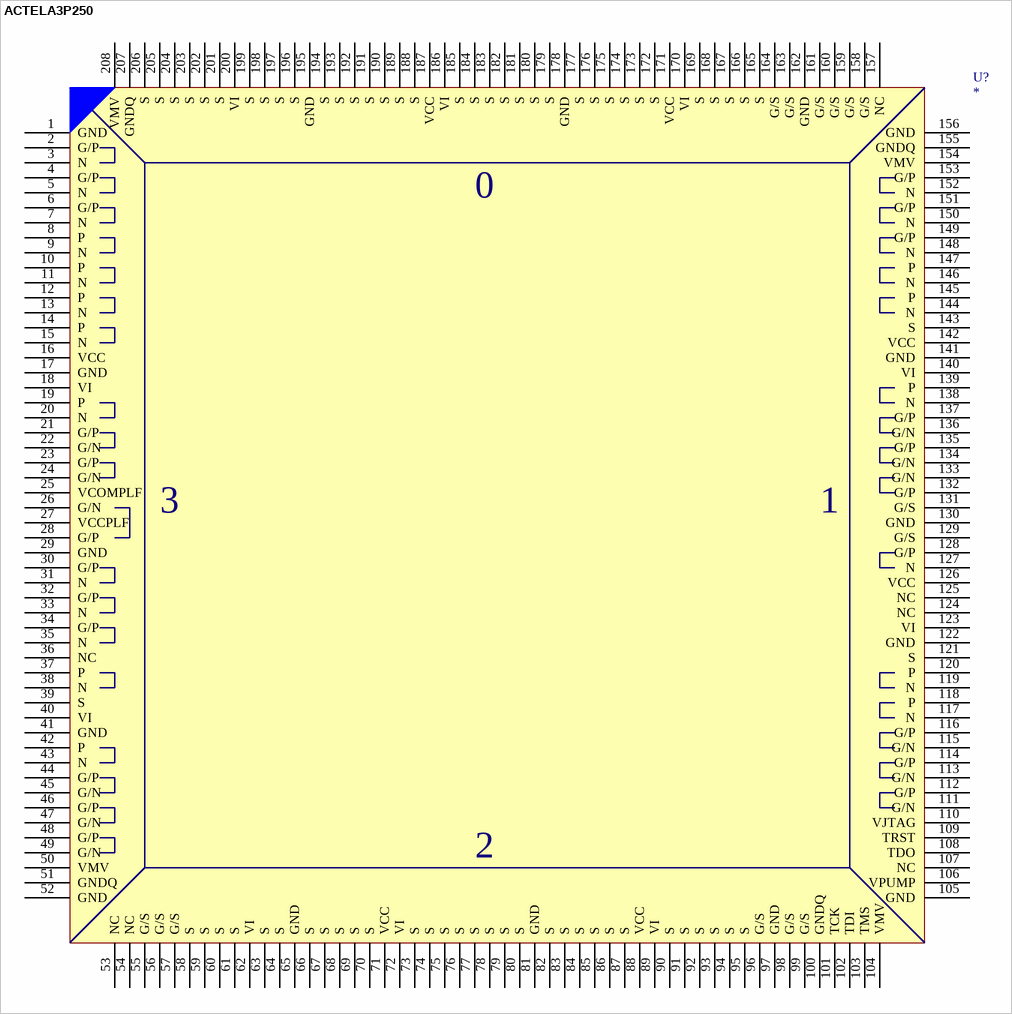
[diagram p9: symbol ACTELA3P250]

## ACTELA3P250
designator U?
footprint PQFP208
pins: 1 GND, 2 G/P, 3 N, 4 G/P, 5 N, 6 G/P, 7 N, 8 P, 9 N, 10 P, 11 N, 12 P, 13 N, 14 P, 15 N, 16 VCC, 17 GND, 18 VI, 19 P, 20 N, 21 G/P, 22 G/N, 23 G/P, 24 G/N, 25 VCOMPLF, 26 G/N, 27 VCCPLF, 28 G/P, 29 GND, 30 G/P, 31 N, 32 G/P, 33 N, 34 G/P, 35 N, 36 NC, 37 P, 38 N, 39 S, 40 VI, 41 GND, 42 P, 43 N, 44 G/P, 45 G/N, 46 G/P, 47 G/N, 48 G/P, 49 G/N, 50 VMV, 51 GNDQ, 52 GND, 53 NC, 54 NC, 55 G/S, 56 G/S, 57 G/S, 58 S, 59 S, 60 S, 61 S, 62 VI, 63 S, 64 S, 65 GND, 66 S, 67 S, 68 S, 69 S, 70 S, 71 VCC, 72 VI, 73 S, 74 S, 75 S, 76 S, 77 S, 78 S, 79 S, 80 S, 81 GND, 82 S, 83 S, 84 S, 85 S, 86 S, 87 S, 88 VCC, 89 VI, 90 S, 91 S, 92 S, 93 S, 94 S, 95 S, 96 G/S, 97 GND, 98 G/S, 99 G/S, 100 GNDQ, 101 TCK, 102 TDI, 103 TMS, 104 VMV, 105 GND, 106 VPUMP, 107 NC, 108 TDO, 109 TRST, 110 VJTAG, 111 G/N, 112 G/P, 113 G/N, 114 G/P, 115 G/N, 116 G/P, 117 N, 118 P, 119 N, 120 P, 121 S, 122 GND, 123 VI, 124 NC, 125 NC, 126 VCC, 127 N, 128 G/P, 129 G/S, 130 GND, 131 G/S, 132 G/P, 133 G/N, 134 G/N, 135 G/P, 136 G/N, 137 G/P, 138 N, 139 P, 140 VI, 141 GND, 142 VCC, 143 S, 144 N, 145 P, 146 N, 147 P, 148 N, 149 G/P, 150 N, 151 G/P, 152 N, 153 G/P, 154 VMV, 155 GNDQ, 156 GND, 157 NC, 158 G/S, 159 G/S, 160 G/S, 161 G/S, 162 GND, 163 G/S, 164 G/S, 165 S, 166 S, 167 S, 168 S, 169 S, 170 VI, 171 VCC, 172 S, 173 S, 174 S, 175 S, 176 S, 177 S, 178 GND, 179 S, 180 S, 181 S, 182 S, 183 S, 184 S, 185 S, 186 VI, 187 VCC, 188 S, 189 S, 190 S, 191 S, 192 S, 193 S, 194 S, 195 GND, 196 S, 197 S, 198 S, 199 S, 200 VI, 201 S, 202 S, 203 S, 204 S, 205 S, 206 S, 207 GNDQ, 208 VMV
